# Altium footprint library UWRT_Footprint_Library_2020.PcbLib: 376 footprints (part 1 of 24)
Each footprint in its own frame and in the unit in brackets; x right, y up, seen from the top. Pads: shape width x height; smd on the part's side, far side on the other; paste and mask are expansions set on the pad; w line width, h text height; cw(c..) or ccw(c..) is an arc to the next point about the centre after c.
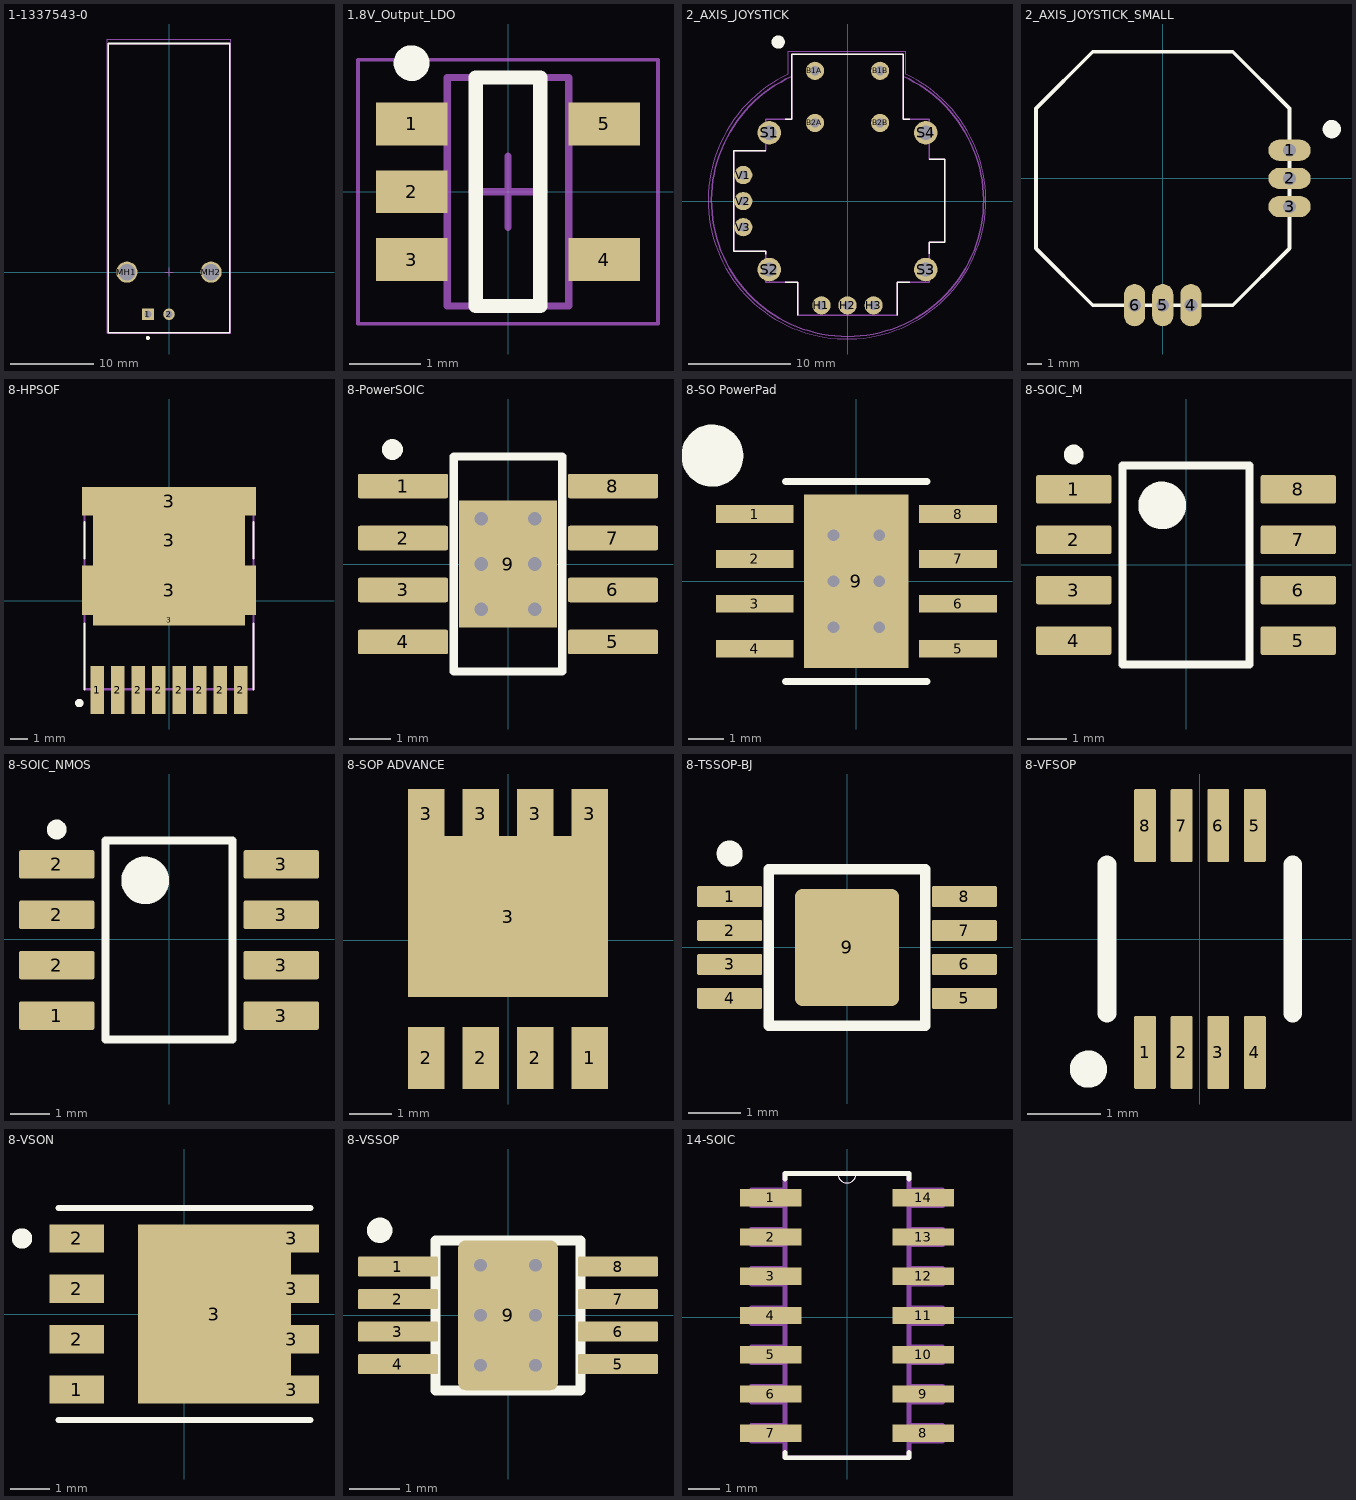
[diagram p0: the footprints below, top view; thin cyan lines are the x and y axes]

## 1-1337543-0 [mm]
pads (4):
  rect 1.4x1.4 hole 0.89: 1(-2.54,-5.08)
  round 1.4 hole 0.89: 2(0,-5.08)
  round 2.55 hole 2.01: MH1(-5.08,0) MH2(5.08,0)
Top Overlay:
  circle w0.25: c-2.54,-7.95 r0.125
  lines w0.2: -7.35,-7.3 7.35,-7.3 7.35,27.6 -7.35,27.6 -7.35,-7.3
Mechanical 13:
  lines w0.1: -7.35,-7.3 -7.35,27.6 7.35,27.6 7.35,-7.3 -7.35,-7.3
Mechanical 15:
  lines w0.05: -7.45,-7.4 -7.45,28.15 7.45,28.15 7.45,-7.4 -7.45,-7.4
  lines w0.1: -0.5,0 0.5,0 ; 0,-0.5 0,0.5
3D body "c-1-1337543-0-e-3d.stp": height 15.8, standoff -4.3, extent -7.35,-7.1 7.35,28.05

## 1.8V_Output_LDO [mm] "Linear Voltage Regulator IC Positive Fixed 1 Output 300mA 5-TSOP"
pads (5):
  rect 1x0.6 smd: 1(-1.35,0.95) 2(-1.35,0) 3(-1.35,-0.95) 4(1.35,-0.95) 5(1.35,0.95)
Top Overlay:
  circle w0.25: c-1.35,1.8 r0.125
  lines w0.2: -0.45,-1.6 -0.45,1.6 0.45,1.6 0.45,-1.6 -0.45,-1.6
Mechanical 13:
  lines w0.1: -0.85,-1.6 -0.85,1.6 0.85,1.6 0.85,-1.6 -0.85,-1.6
Mechanical 15:
  lines w0.05: -2.1,-1.85 -2.1,1.85 2.1,1.85 2.1,-1.85 -2.1,-1.85
  lines w0.1: -0.5,0 0.5,0 ; 0,-0.5 0,0.5
3D body: height 1.1, standoff 0.1, extent -0.85,-1.6 0.85,1.6

## 2_AXIS_JOYSTICK [mil]
pads (14):
  round 70 hole 35.43: B1A(-125,500) B1B(125,500) B2A(-125,300) B2B(125,300)
  round 70 hole 35: H1(-100,-400) H2(0,-400) H3(100,-400) V1(-400,100) V2(-400,0) V3(-400,-100)
  round 90 hole 55: S1(-300,262.5) S2(-300,-262.5) S3(300,-262.5) S4(300,262.5)
Top Overlay:
  circle w27.56: c-265.75,610.24 r11.81
  lines w5: -312.99,-203.54 -312.99,-192.91 -437.01,-192.91 -437.01,192.91 -312.99,192.91 ; -238.98,-311.02 -190.94,-311.02 -190.94,-437.01 ; -238.98,314.96 -214.57,314.96 -214.57,562.99 214.57,562.99 214.57,314.96 239.37,314.96 ; 190.94,-437.01 190.94,-311.02 239.37,-311.02 ; 312.99,-201.57 312.99,-157.48 374.02,-157.48 374.02,161.42 312.99,161.42
Mechanical 13:
  lines w5: -212.33,479.35 ccw(c0,2.45) 212.33,479.35 ; -437.01,-192.91 -312.99,-192.91 -312.99,-311.02 -190.94,-311.02 -190.94,-437.01 190.94,-437.01 190.94,-311.02 312.99,-311.02 312.99,-157.48 374.02,-157.48 374.02,161.42 312.99,161.42 312.99,314.96 214.57,314.96 214.57,562.99 -214.57,562.99 -214.57,314.96 -312.99,314.96 -312.99,192.91 -437.01,192.91 -437.01,-192.91
Mechanical 15:
  lines w1.97: -228.35,486.22 -228.35,574.8 224.41,574.8 224.41,486.22 ; -227.17,486.77 ccw(c-1.97,3.83) 223.23,486.77
3D body "9032.STEP": height 1190, standoff -175, extent -522.49,-527.49 527.51,560

## 2_AXIS_JOYSTICK_SMALL [mm]
pads (6):
  oval 3x1.5 hole 0.9: 1(9,2) 2(9,0) 3(9,-2)
  oval 1.5x3 hole 0.9: 4(2,-9) 5(0,-9) 6(-2,-9)
Top Overlay:
  circle w0.7: c12,3.5 r0.3
  lines w0.254: -9,-4.97 -4.97,-9 0,-9 4.97,-9 9,-4.97 9,0 9,4.97 4.97,9 0,9 -4.97,9 -9,4.97 -9,0 -9,-4.97

## 5V_BUCK_3D_MODEL [mm]
3D body "48V-5V Buck.step": height 44.04, standoff 1.14, extent -22.504,-8.128 23.012,7.862

## 8-HPSOF [mm]
pads (12):
  rect 0.8x2.8 smd: 1(-4.2,-5.24) 2(-3,-5.24) 2(-1.8,-5.24) 2(-0.6,-5.24) 2(0.6,-5.24) 2(1.8,-5.24) 2(3,-5.24) 2(4.2,-5.24)
  rect 8.9x0.6 smd: 3(0,-1.16)
  rect 10.2x2.9 smd: 3(0,0.59)
  rect 8.9x2.95 smd: 3(0,3.515)
  rect 10.2x1.65 smd: 3(0,5.815)
Top Overlay:
  circle w0.24: c-5.25,-6 r0.12
  lines w0.127: -4.95,-5.19 -4.95,-1.35 ; -4.95,2.45 -4.95,4.6 ; 4.95,-5.19 4.95,-1.35 ; 4.95,2.45 4.95,4.6
Top Paste:
  region: -2.811,5.15 2.81,5.15 2.81,0.03 -2.811,0.03
Mechanical 4:
  circle w0.25: c-5.25,-6 r0.12
  lines w0.127: -4.95,-5.19 -4.95,5.19 ; -4.95,-5.19 4.95,-5.19 ; -4.95,-5.19 4.95,-5.19 ; -4.95,-5.19 -4.95,5.19 ; -4.95,5.19 4.95,5.19 ; -4.95,5.19 4.95,5.19 ; 4.95,-5.19 4.95,5.19 ; 4.95,-5.19 4.95,5.19
3D body "User Library-PG-HSOF-8-1.step": height 2.3, standoff 0, extent -4.95,-5.834 4.95,5.841

## 8-PowerSOIC [mm] "Texas Instruments 8-SO PowerPad"
pads (9):
  rrect15% 2.2x0.6 smd: 1(-2.565,1.905) 2(-2.565,0.635) 3(-2.565,-0.635) 4(-2.565,-1.905) 5(2.565,-1.905) 6(2.565,-0.635) 7(2.565,0.635) 8(2.565,1.905)
  rect 2.4x3.1 smd: 9(0,0)
via -0.65,-1.1 diameter 0.63 hole 0.33
via 0.65,-1.1 diameter 0.63 hole 0.33
via 0.65,1.1 diameter 0.63 hole 0.33
via -0.65,1.1 diameter 0.63 hole 0.33
via -0.65,0 diameter 0.63 hole 0.33
via 0.65,0 diameter 0.63 hole 0.33
Top Overlay:
  circle w0.254: c-2.824,2.797 r0.127
  lines w0.2: -1.325,-2.625 1.324,-2.625 1.324,2.625 -1.325,2.625 ; -1.324,-2.625 -1.324,2.625
3D body "SOIC-8.step": height 1.75, standoff 0, extent -3,-2.45 3,2.45

## 8-SO PowerPad [mm]
pads (9):
  rect 2.2x0.5 smd paste-1000 mask+0: 1(-2.875,1.905) 2(-2.875,0.635) 3(-2.875,-0.635) 4(-2.875,-1.905) 5(2.875,-1.905) 6(2.875,-0.635) 7(2.875,0.635) 8(2.875,1.905)
  rect 2.95x4.9 smd paste-1000 mask-1000: 9(0,0)
via 0.65,-1.3 diameter 0.63 hole 0.33
via 0.65,0 diameter 0.63 hole 0.33
via 0.65,1.3 diameter 0.63 hole 0.33
via -0.65,-1.3 diameter 0.63 hole 0.33
via -0.65,0 diameter 0.63 hole 0.33
via -0.65,1.3 diameter 0.63 hole 0.33
Top Overlay:
  circle w0.889: c-4.075,3.556 r0.432
  lines w0.2: -2,-2.825 2,-2.825 ; -2,2.825 2,2.825
Top Paste:
  rectangle: 1.8,-2.13 3.95,-1.68
  rectangle: 1.8,-0.86 3.95,-0.41
  rectangle: 1.8,0.41 3.95,0.86
  rectangle: 1.8,1.68 3.95,2.13
  rectangle: -3.95,-2.13 -1.8,-1.68
  rectangle: -3.95,-0.86 -1.8,-0.41
  rectangle: -3.95,0.41 -1.8,0.86
  rectangle: -3.95,1.68 -1.8,2.13
  rectangle: -1.2,-1.55 1.2,1.55
Top Solder:
  rectangle: -1.2,-1.55 1.2,1.55
Mechanical 16:
  lines w0.1: -0.5,0 0.5,0 ; 0,-0.5 0,0.5
3D body "IC_Texas_Instruments_TPS54360BQDDARQ1_eec.STEP": height 0.25, standoff 0, extent -4.075,-2.675 4.075,2.675

## 8-SOIC_M [mm] "SOIC, 8-Leads, Body 5x4mm, Pitch 1.27mm, IPC Low Density"
height 1.75
pads (8):
  rrect15% 1.9x0.72 smd: 1(-2.825,1.905) 2(-2.825,0.635) 3(-2.825,-0.635) 4(-2.825,-1.905) 5(2.825,-1.905) 6(2.825,-0.635) 7(2.825,0.635) 8(2.825,1.905)
Top Overlay:
  circle w0.25: c-2.825,2.78 r0.125
  circle w0.6: c-0.6,1.5 r0.3
  lines w0.2: -1.6,-2.5 -1.6,2.5 1.6,2.5 1.6,-2.5 -1.6,-2.5
3D body "SOIC-8akaD0008AakaM08A.stp": height 1.63, standoff 0, extent -3,-2.45 3,2.45

## 8-SOIC_NMOS [mm]
pads (8):
  rrect15% 1.9x0.72 smd: 1(-2.827,-1.926) 2(-2.827,-0.656) 2(-2.827,0.614) 2(-2.827,1.884) 3(2.823,-1.926) 3(2.823,-0.656) 3(2.823,0.614) 3(2.823,1.884)
Top Overlay:
  circle w0.25: c-2.827,2.759 r0.125
  circle w0.6: c-0.602,1.479 r0.3
  lines w0.2: -1.602,-2.521 -1.602,2.479 1.598,2.479 1.598,-2.521 -1.602,-2.521
3D body "SOIC-8akaD0008AakaM08A.stp": height 1.63, standoff 0, extent -3,-2.45 3,2.45

## 8-SOP ADVANCE [mm]
pads (9):
  rect 0.85x1.45 smd: 1(1.905,-2.75) 2(-1.905,-2.75) 2(-0.635,-2.75) 2(0.635,-2.75)
  rect 0.85x1.15 smd: 3(-1.905,2.95) 3(-0.635,2.95) 3(0.635,2.95) 3(1.905,2.95)
  rect 4.66x3.75 smd: 3(0,0.55)
3D body "TPHR8504PL,L1Q.STEP": height 1, standoff 0, extent -2.65,-3 2.65,3

## 8-TSSOP-BJ [mm]
pads (9):
  rrect15% 1.25x0.4 smd: 1(-2.25,0.975) 2(-2.25,0.325) 3(-2.25,-0.325) 4(-2.25,-0.975) 5(2.25,-0.975) 6(2.25,-0.325) 7(2.25,0.325) 8(2.25,0.975)
  rrect15% 2x2.25 smd: 9(0,0)
Top Overlay:
  circle w0.25: c-2.25,1.8 r0.125
  lines w0.2: -1.5,-1.5 -1.5,1.5 1.5,1.5 1.5,-1.5 -1.5,-1.5
3D body "MSOP-8.step": height 1.09, standoff -0.01, extent -2.475,-1.5 2.525,1.5

## 8-VFSOP [mm]
pads (8):
  rrect15% 0.3x1 smd: 1(-0.75,-1.55) 2(-0.25,-1.55) 3(0.25,-1.55) 4(0.75,-1.55) 5(0.75,1.55) 6(0.25,1.55) 7(-0.25,1.55) 8(-0.75,1.55)
Top Overlay:
  circle w0.254: c-1.524,-1.778 r0.127
  lines w0.254: -1.27,-1.016 -1.27,1.016 ; 1.27,-1.016 1.27,1.016
3D body "User Library-TSSOP50P310X90-8N.STEP": height 0.9, standoff 0, extent -1.05,-1.549 1.05,1.549

## 8-VSON [mm]
pads (9):
  rect 1.372x0.71 smd paste-0.673: 1(-2.712,-1.905) 2(-2.712,-0.635) 2(-2.712,0.635) 2(-2.712,1.905) 3(2.712,-1.905) 3(2.712,-0.635) 3(2.712,0.635) 3(2.712,1.905)
  rect 3.85x4.52 smd paste-0.673: 3(0.762,0)
Top Overlay:
  circle w0.36: c-4.091,1.905 r0.076
  lines w0.152: -3.177,-2.677 3.177,-2.677 ; -3.177,2.677 3.177,2.677
3D body "DNK0008A.stp": height 1, standoff 0, extent -3,-2.5 3,2.5

## 8-VSSOP [mm] "Texas Instruments 8-SO PowerPad"
pads (9):
  rrect15% 1.6x0.4 smd: 1(-2.2,0.975) 2(-2.2,0.325) 3(-2.2,-0.325) 4(-2.2,-0.975) 5(2.2,-0.975) 6(2.2,-0.325) 7(2.2,0.325) 8(2.2,0.975)
  rrect15% 2x3 smd: 9(0,0)
via -0.55,1 diameter 0.508 hole 0.254
via 0.55,1 diameter 0.508 hole 0.254
via -0.55,0 diameter 0.508 hole 0.254
via 0.55,0 diameter 0.508 hole 0.254
via -0.55,-1 diameter 0.508 hole 0.254
via 0.55,-1 diameter 0.508 hole 0.254
Top Overlay:
  circle w0.254: c-2.565,1.7 r0.127
  lines w0.2: -1.45,-1.5 -1.45,1.5 1.45,1.5 1.45,-1.5 -1.45,-1.5
3D body "8-VSSOP.step": height 1.1, standoff 0, extent -2.469,-1.55 2.469,1.55

## 14-SOIC [mil]
pads (14):
  rect 78x22 smd: 1(-97.12,152.09) 2(-97.12,102.09) 3(-97.12,52.09) 4(-97.12,2.09) 5(-97.12,-47.91) 6(-97.12,-97.91) 7(-97.12,-147.91) 8(96.88,-147.91) 9(96.88,-97.91) 10(96.88,-47.91) 11(96.88,2.09) 12(96.88,52.09) 13(96.88,102.09) 14(96.88,152.09)
Top Overlay:
  lines w0: -12.12,183.09 ccw(c-0.12,183.09) 11.88,183.09
  lines w6: -79.12,-171.91 -79.12,-178.91 78.88,-178.91 78.88,-171.91 ; -79.12,176.09 -79.12,183.09 -12.12,183.09 11.88,183.09 78.88,183.09 78.88,176.09
Mechanical 13:
  lines w0: -12.12,183.09 ccw(c-0.12,183.09) 11.88,183.09
  lines w6: -122.12,-157.91 -122.12,-137.91 -79.12,-137.91 -79.12,-157.91 -122.12,-157.91 ; -122.12,-107.91 -122.12,-87.91 -79.12,-87.91 -79.12,-107.91 -122.12,-107.91 ; -122.12,-57.91 -122.12,-37.91 -79.12,-37.91 -79.12,-57.91 -122.12,-57.91 ; -122.12,-7.91 -122.12,12.09 -79.12,12.09 -79.12,-7.91 -122.12,-7.91 ; -122.12,42.09 -122.12,62.09 -79.12,62.09 -79.12,42.09 -122.12,42.09 ; -122.12,92.09 -122.12,112.09 -79.12,112.09 -79.12,92.09 -122.12,92.09 ; -122.12,142.09 -122.12,162.09 -79.12,162.09 -79.12,142.09 -122.12,142.09 ; -79.12,-178.91 78.88,-178.91 78.88,183.09 11.88,183.09 -12.12,183.09 -79.12,183.09 -79.12,-178.91 ; 78.88,-157.91 78.88,-137.91 121.88,-137.91 121.88,-157.91 78.88,-157.91 ; 78.88,-107.91 78.88,-87.91 121.88,-87.91 121.88,-107.91 78.88,-107.91 ; 78.88,-57.91 78.88,-37.91 121.88,-37.91 121.88,-57.91 78.88,-57.91 ; 78.88,-7.91 78.88,12.09 121.88,12.09 121.88,-7.91 78.88,-7.91 ; 78.88,42.09 78.88,62.09 121.88,62.09 121.88,42.09 78.88,42.09 ; 78.88,92.09 78.88,112.09 121.88,112.09 121.88,92.09 78.88,92.09 ; 78.88,142.09 78.88,162.09 121.88,162.09 121.88,142.09 78.88,142.09
3D body "step_temp.STEP": height 68.9, standoff 0, extent -118.23,-168.19 117.99,172.36